# Altium footprint library TH_Connectors.PcbLib: 83 footprints (part 5 of 6)
Each footprint in its own frame and in the unit in brackets; x right, y up, seen from the top. Pads: shape width x height; smd on the part's side, far side on the other; paste and mask are expansions set on the pad; w line width, h text height; cw(c..) or ccw(c..) is an arc to the next point about the centre after c.
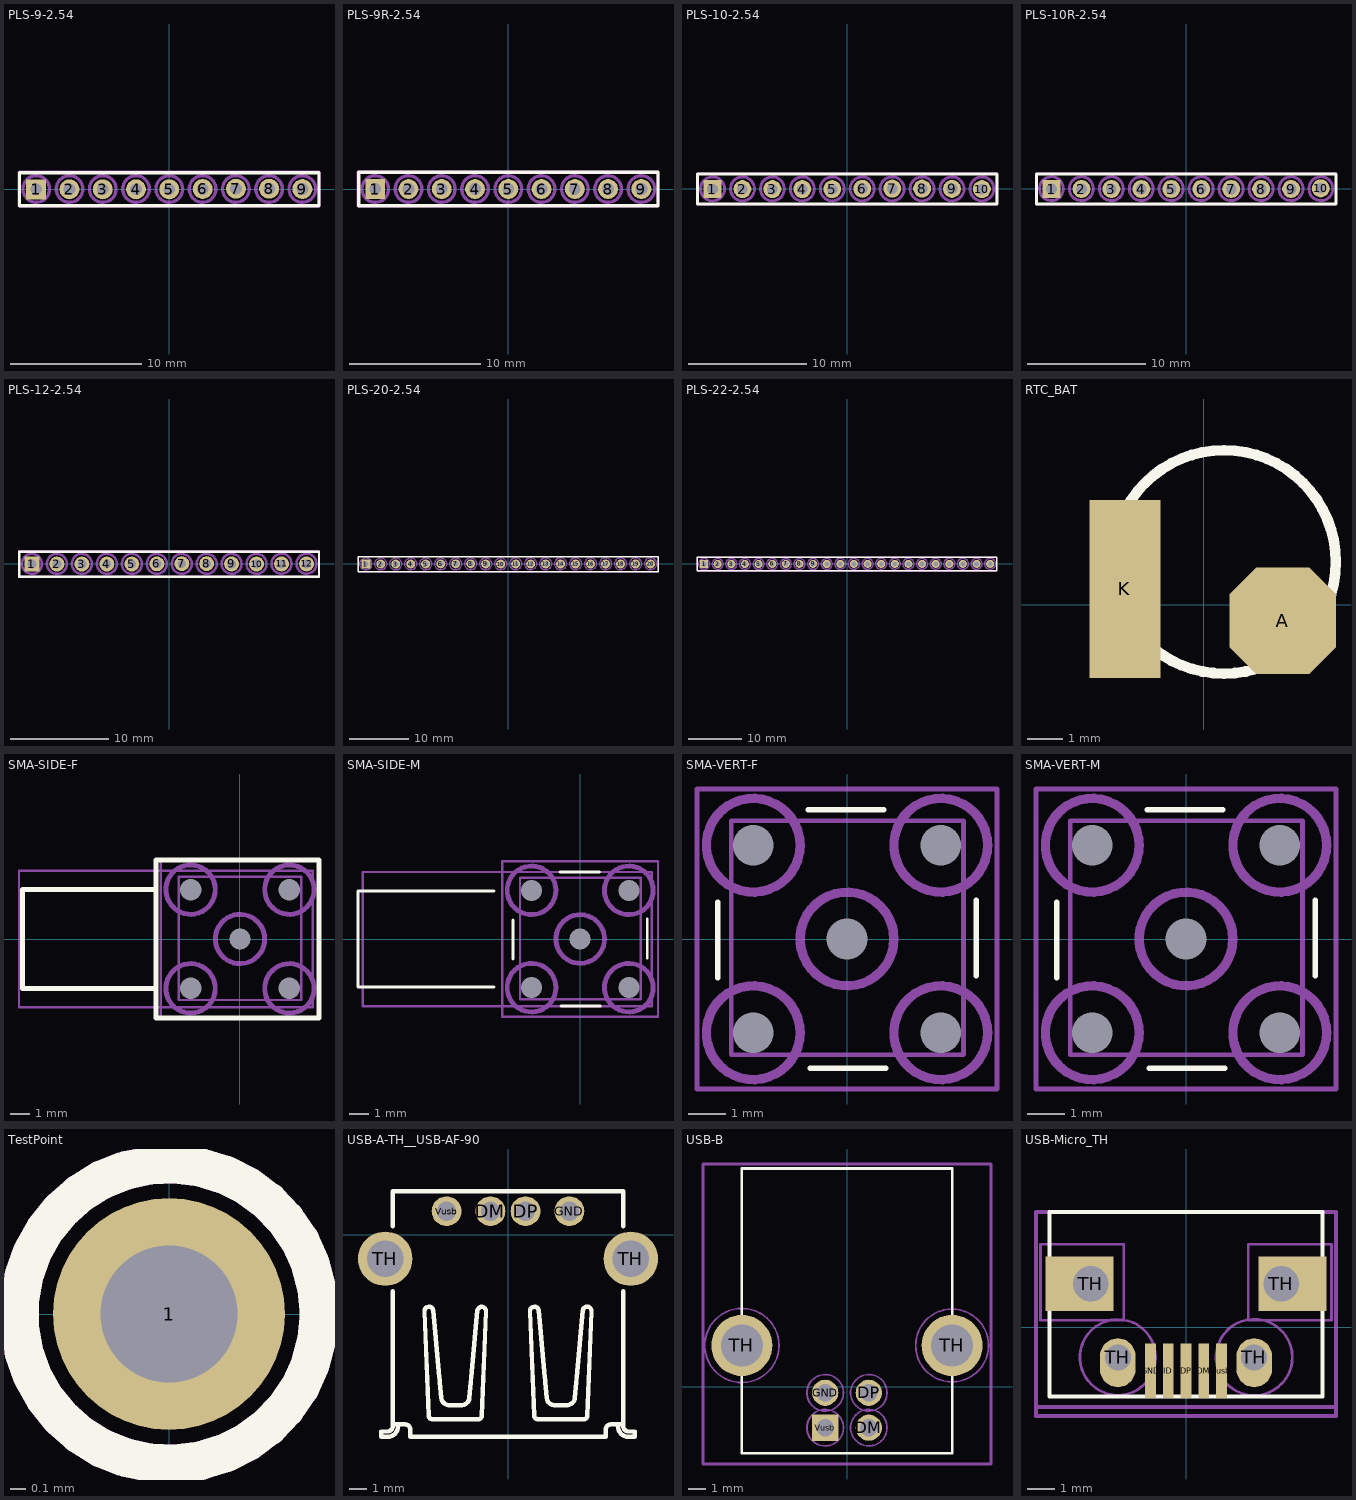
[diagram p4: the footprints below, top view; thin cyan lines are the x and y axes]

## PLS-9-2.54 [mil]
pads (9):
  rect 60x60 hole 35.43: 1(-400.06,-0.78)
  round 60 hole 35.43: 2(-300.06,-0.78) 3(-200.06,-0.78) 4(-100.06,-0.78) 5(-0.06,-0.78) 6(100.43,0.26) 7(200.43,0.78) 8(300.18,0.78) 9(400.06,0)
Top Overlay:
  lines w10: -450.06,-50.78 450.06,-50.78 450.06,49.22 -450.06,49.22 -450.06,-50.78
Top Assembly:
  lines w7.87: -451.81,-51.12 450,-51.12 450,51.25 -451.81,51.25 -451.81,-51.12
Top Courtyard:
  lines w7.87: -451.81,-51.12 450,-51.12 450,51.25 -451.81,51.25 -451.81,-51.12
Bottom Courtyard (Mech16):
  circle w10: c-400,0 r40.05
  circle w10: c-300,0 r40.05
  circle w10: c-200,0 r40.05
  circle w10: c-100,0 r40.05
  circle w10: c0,0 r40.05
  circle w10: c100,0 r40.05
  circle w10: c200,0 r40.05
  circle w10: c300,0 r40.05
  circle w10: c400,0 r40.05
3D body "PLS1.stp": height 336.22, standoff -118.11, extent 350.06,-50 450.06,50
3D body "PLS1.stp": height 336.22, standoff -118.11, extent 250.18,-49.23 350.18,50.77
3D body "PLS1.stp": height 336.22, standoff -118.11, extent 150.43,-49.23 250.43,50.77
3D body "PLS1.stp": height 336.22, standoff -118.11, extent 50.43,-49.74 150.43,50.26
3D body "PLS1.stp": height 336.22, standoff -118.11, extent -50.06,-50.77 49.94,49.23
3D body "PLS1.stp": height 336.22, standoff -118.11, extent -250.06,-50.77 -150.06,49.23
3D body "PLS1.stp": height 336.22, standoff -118.11, extent -350.06,-50.77 -250.06,49.23
3D body "PLS1.stp": height 336.22, standoff -118.11, extent -450.06,-50.77 -350.06,49.23
3D body "PLS1.stp": height 336.22, standoff -118.11, extent -150.06,-50.77 -50.06,49.23

## PLS-9R-2.54 [mil]
pads (9):
  rect 60x60 hole 35.43: 1(-400,0)
  round 60 hole 35.43: 2(-300,0) 3(-200,0) 4(-100,0) 5(0,0) 6(100,0) 7(200,0) 8(300,0) 9(400,0)
Top Overlay:
  lines w10: -250,50 150,50 -350,50 50,50 ; -450,-50 -450,50 450,50 450,-50 -450,-50
Top Assembly:
  lines w7.87: -451.81,-51.12 -451.81,51.25 450,51.25 450,-51.12 -451.81,-51.12
Top Courtyard:
  lines w7.87: -451.81,-51.12 450,-51.12 450,51.25 -451.81,51.25 -451.81,-51.12
Bottom Courtyard (Mech16):
  circle w10: c400,0 r40.05
  circle w10: c300,0 r40.05
  circle w10: c200,0 r40.05
  circle w10: c100,0 r40.05
  circle w10: c0,0 r40.05
  circle w10: c-100,0 r40.05
  circle w10: c-200,0 r40.05
  circle w10: c-300,0 r40.05
  circle w10: c-400,0 r40.05
3D body "User Library-PLS-1R.STEP": height 229.57, standoff -103.11, extent 350,-50 450,289.37
3D body "User Library-PLS-1R.STEP": height 229.57, standoff -103.11, extent 250,-50 350,289.37
3D body "User Library-PLS-1R.STEP": height 229.57, standoff -103.11, extent -350,-50 -250,289.37
3D body "User Library-PLS-1R.STEP": height 229.57, standoff -103.11, extent -450,-50 -350,289.37
3D body "User Library-PLS-1R.STEP": height 229.57, standoff -103.11, extent -150,-50 -50,289.37
3D body "User Library-PLS-1R.STEP": height 229.57, standoff -103.11, extent -250,-50 -150,289.37
3D body "User Library-PLS-1R.STEP": height 229.57, standoff -103.11, extent -50,-50 50,289.37
3D body "User Library-PLS-1R.STEP": height 229.57, standoff -103.11, extent 50,-50 150,289.37
3D body "User Library-PLS-1R.STEP": height 229.57, standoff -103.11, extent 150,-50 250,289.37

## PLS-10-2.54 [mil]
pads (10):
  rect 60x60 hole 35.43: 1(-450.03,-0.78)
  round 60 hole 35.43: 2(-350.03,-0.78) 3(-250.03,-0.78) 4(-150.03,-0.78) 5(-50.03,-0.78) 6(50.46,0.26) 7(150.46,0.78) 8(250.21,0.78) 9(350.09,0) 10(450.03,-0.78)
Top Overlay:
  lines w10: -500.03,-50.78 -500.03,49.22 500.03,49.22 500.03,-50.78 -500.03,-50.78
Top Assembly:
  lines w7.87: -501.4,-52.18 500.41,-52.18 500.41,50.2 -501.4,50.2 -501.4,-52.18
Top Courtyard:
  lines w7.87: -501.81,-51.12 500,-51.12 500,51.25 -501.81,51.25 -501.81,-51.12
Bottom Courtyard (Mech16):
  circle w10: c450,0 r40.05
  circle w10: c350,0 r40.05
  circle w10: c250,0 r40.05
  circle w10: c150,0 r40.05
  circle w10: c50,0 r40.05
  circle w10: c-50,0 r40.05
  circle w10: c-150,0 r40.05
  circle w10: c-250,0 r40.05
  circle w10: c-350,0 r40.05
  circle w10: c-450,0 r40.05
3D body "PLS1.stp": height 336.22, standoff -118.11, extent -200.03,-50.77 -100.03,49.23
3D body "PLS1.stp": height 336.22, standoff -118.11, extent -500.03,-50.77 -400.03,49.23
3D body "PLS1.stp": height 336.22, standoff -118.11, extent -400.03,-50.77 -300.03,49.23
3D body "PLS1.stp": height 336.22, standoff -118.11, extent -300.03,-50.77 -200.03,49.23
3D body "PLS1.stp": height 336.22, standoff -118.11, extent -100.03,-50.77 -0.03,49.23
3D body "PLS1.stp": height 336.22, standoff -118.11, extent 0.46,-49.74 100.46,50.26
3D body "PLS1.stp": height 336.22, standoff -118.11, extent 100.46,-49.23 200.46,50.77
3D body "PLS1.stp": height 336.22, standoff -118.11, extent 200.21,-49.23 300.21,50.77
3D body "PLS1.stp": height 336.22, standoff -118.11, extent 300.09,-50 400.09,50
3D body "PLS1.stp": height 336.22, standoff -118.11, extent 400.03,-50.77 500.03,49.23

## PLS-10R-2.54 [mil]
pads (10):
  rect 60x60 hole 35.43: 1(-449.59,-1.05)
  round 60 hole 35.43: 2(-349.59,-1.05) 3(-249.59,-1.05) 4(-149.59,-1.05) 5(-49.59,-1.05) 6(50.41,-1.05) 7(150.41,-1.05) 8(250.41,-1.05) 9(350.41,-1.05) 10(449.59,1.05)
Top Overlay:
  lines w10: -299.59,48.95 100.41,48.95 -399.59,48.95 0.41,48.95 ; -499.59,-51.05 -499.59,48.95 500.41,48.95 500.41,-51.05 -499.59,-51.05
Top Assembly:
  lines w7.87: -501.4,-52.18 -501.4,50.2 500.41,50.2 500.41,-52.18 -501.4,-52.18
Top Courtyard:
  lines w7.87: -501.4,-52.18 500.41,-52.18 500.41,50.2 -501.4,50.2 -501.4,-52.18
Bottom Courtyard (Mech16):
  circle w10: c-450,0 r40.05
  circle w10: c-350,0 r40.05
  circle w10: c-250,0 r40.05
  circle w10: c-150,0 r40.05
  circle w10: c-50,0 r40.05
  circle w10: c50,0 r40.05
  circle w10: c150,0 r40.05
  circle w10: c250,0 r40.05
  circle w10: c350,0 r40.05
  circle w10: c450,0 r40.05
3D body "User Library-PLS-1R.STEP": height 229.57, standoff -103.11, extent 300.41,-51.05 400.41,288.32
3D body "User Library-PLS-1R.STEP": height 229.57, standoff -103.11, extent 200.41,-51.05 300.41,288.32
3D body "User Library-PLS-1R.STEP": height 229.57, standoff -103.11, extent -399.59,-51.05 -299.59,288.32
3D body "User Library-PLS-1R.STEP": height 229.57, standoff -103.11, extent -499.59,-51.05 -399.59,288.32
3D body "User Library-PLS-1R.STEP": height 229.57, standoff -103.11, extent -199.59,-51.05 -99.59,288.32
3D body "User Library-PLS-1R.STEP": height 229.57, standoff -103.11, extent -299.59,-51.05 -199.59,288.32
3D body "User Library-PLS-1R.STEP": height 229.57, standoff -103.11, extent -99.59,-51.05 0.41,288.32
3D body "User Library-PLS-1R.STEP": height 229.57, standoff -103.11, extent 0.41,-51.05 100.41,288.32
3D body "User Library-PLS-1R.STEP": height 229.57, standoff -103.11, extent 100.41,-51.05 200.41,288.32
3D body "User Library-PLS-1R.STEP": height 229.57, standoff -103.11, extent 400.41,-51.05 500.41,288.32

## PLS-12-2.54 [mil]
pads (12):
  rect 60x60 hole 35.43: 1(-550.02,-0.78)
  round 60 hole 35.43: 2(-450.02,-0.78) 3(-350.02,-0.78) 4(-250.02,-0.78) 5(-150.02,-0.78) 6(-49.53,0.26) 7(50.47,0.78) 8(150.23,0.78) 9(250.11,0) 10(350.05,-0.78) 11(450.02,0) 12(550.02,0)
Top Overlay:
  lines w10: -600.02,-50.78 -600.02,49.22 600.02,49.22 600.02,-50.78 -600.02,-50.78
Top Assembly:
  lines w7.87: -601.39,-52.18 600.02,-52.18 600.02,50.2 -601.39,50.2 -601.39,-52.18
Top Courtyard:
  lines w7.87: -601.8,-51.12 600.02,-51.12 600.02,51.25 -601.8,51.25 -601.8,-51.12
Bottom Courtyard (Mech16):
  circle w10: c549.98,0.78 r40.05
  circle w10: c449.98,0.78 r40.05
  circle w10: c350.02,0 r40.05
  circle w10: c250.02,0 r40.05
  circle w10: c150.02,0 r40.05
  circle w10: c50.02,0 r40.05
  circle w10: c-49.98,0 r40.05
  circle w10: c-149.98,0 r40.05
  circle w10: c-249.98,0 r40.05
  circle w10: c-349.98,0 r40.05
  circle w10: c-449.98,0 r40.05
  circle w10: c-549.98,0 r40.05
3D body "PLS1.stp": height 336.22, standoff -118.11, extent 500.01,-50 600.01,50
3D body "PLS1.stp": height 336.22, standoff -118.11, extent 400.01,-50 500.01,50
3D body "PLS1.stp": height 336.22, standoff -118.11, extent -300.01,-50.77 -200.01,49.23
3D body "PLS1.stp": height 336.22, standoff -118.11, extent -600.01,-50.77 -500.01,49.23
3D body "PLS1.stp": height 336.22, standoff -118.11, extent -500.01,-50.77 -400.01,49.23
3D body "PLS1.stp": height 336.22, standoff -118.11, extent -400.01,-50.77 -300.01,49.23
3D body "PLS1.stp": height 336.22, standoff -118.11, extent -200.01,-50.77 -100.01,49.23
3D body "PLS1.stp": height 336.22, standoff -118.11, extent -99.53,-49.74 0.47,50.26
3D body "PLS1.stp": height 336.22, standoff -118.11, extent 0.47,-49.23 100.47,50.77
3D body "PLS1.stp": height 336.22, standoff -118.11, extent 100.23,-49.23 200.23,50.77
3D body "PLS1.stp": height 336.22, standoff -118.11, extent 200.11,-50 300.11,50
3D body "PLS1.stp": height 336.22, standoff -118.11, extent 300.04,-50.77 400.04,49.23

## PLS-20-2.54 [mil]
pads (20):
  rect 60x60 hole 35.43: 1(-950.01,-0.78)
  round 60 hole 35.43: 2(-850.01,-0.78) 3(-750.01,-0.78) 4(-650.01,-0.78) 5(-550.01,-0.78) 6(-449.52,0.26) 7(-349.52,0.78) 8(-249.76,0.78) 9(-149.89,0) 10(-49.95,-0.78) 11(50.02,0) 12(150.02,0) 13(250.01,0) 14(350.01,0) 15(450.01,0) 16(550.01,0) 17(650.01,0) 18(750.01,0) 19(850.01,0) 20(950.01,0)
Top Overlay:
  lines w10: -1000.01,-50.78 1000.01,-50.78 1000.01,49.22 -1000.01,49.22 -1000.01,-50.78
Top Assembly:
  lines w7.87: -1001.38,-52.18 -1001.38,50.2 1000.01,50.2 1000.01,-52.18 -1001.38,-52.18
Top Courtyard:
  lines w7.87: -1001.79,-51.12 -1001.79,51.25 1000.01,51.25 1000.01,-51.12 -1001.79,-51.12
Bottom Courtyard (Mech16):
  circle w10: c-949.98,0 r40.05
  circle w10: c-849.98,0 r40.05
  circle w10: c-749.98,0 r40.05
  circle w10: c-649.98,0 r40.05
  circle w10: c-549.98,0 r40.05
  circle w10: c-449.98,0 r40.05
  circle w10: c-349.98,0 r40.05
  circle w10: c-249.98,0 r40.05
  circle w10: c-149.98,0 r40.05
  circle w10: c-49.98,0 r40.05
  circle w10: c49.99,0.78 r40.05
  circle w10: c149.99,0.78 r40.05
  circle w10: c249.98,0.78 r40.05
  circle w10: c349.98,0.78 r40.05
  circle w10: c449.98,0.78 r40.05
  circle w10: c549.98,0.78 r40.05
  circle w10: c649.98,0.78 r40.05
  circle w10: c749.98,0.78 r40.05
  circle w10: c849.98,0.78 r40.05
  circle w10: c949.98,0.78 r40.05
3D body "PLS1.stp": height 336.22, standoff -118.11, extent -99.95,-50.77 0.05,49.23
3D body "PLS1.stp": height 336.22, standoff -118.11, extent -199.88,-50 -99.88,50
3D body "PLS1.stp": height 336.22, standoff -118.11, extent -299.76,-49.23 -199.76,50.77
3D body "PLS1.stp": height 336.22, standoff -118.11, extent -399.52,-49.23 -299.52,50.77
3D body "PLS1.stp": height 336.22, standoff -118.11, extent -499.52,-49.74 -399.52,50.26
3D body "PLS1.stp": height 336.22, standoff -118.11, extent -600.01,-50.77 -500.01,49.23
3D body "PLS1.stp": height 336.22, standoff -118.11, extent -800.01,-50.77 -700.01,49.23
3D body "PLS1.stp": height 336.22, standoff -118.11, extent -900.01,-50.77 -800.01,49.23
3D body "PLS1.stp": height 336.22, standoff -118.11, extent -1000.01,-50.77 -900.01,49.23
3D body "PLS1.stp": height 336.22, standoff -118.11, extent -700.01,-50.77 -600.01,49.23
3D body "PLS1.stp": height 336.22, standoff -118.11, extent 0.02,-50 100.02,50
3D body "PLS1.stp": height 336.22, standoff -118.11, extent 100.02,-50 200.02,50
3D body "PLS1.stp": height 336.22, standoff -118.11, extent 200.01,-50 300.01,50
3D body "PLS1.stp": height 336.22, standoff -118.11, extent 300.01,-50 400.01,50
3D body "PLS1.stp": height 336.22, standoff -118.11, extent 400.01,-50 500.01,50
3D body "PLS1.stp": height 336.22, standoff -118.11, extent 500.01,-50 600.01,50
3D body "PLS1.stp": height 336.22, standoff -118.11, extent 600.01,-50 700.01,50
3D body "PLS1.stp": height 336.22, standoff -118.11, extent 700.01,-50 800.01,50
3D body "PLS1.stp": height 336.22, standoff -118.11, extent 800.01,-50 900.01,50
3D body "PLS1.stp": height 336.22, standoff -118.11, extent 900.01,-50 1000.01,50

## PLS-22-2.54 [mil]
pads (22):
  rect 60x60 hole 35.43: 1(-1050,-0.78)
  round 60 hole 35.43: 2(-950,-0.78) 3(-850,-0.78) 4(-750,-0.78) 5(-650,-0.78) 6(-549.52,0.26) 7(-449.52,0.78) 8(-349.76,0.78) 9(-249.88,0) 10(-149.94,-0.78) 11(-49.97,0) 12(50.03,0) 13(150.01,0) 14(250.01,0) 15(350.01,0) 16(450.01,0) 17(550.01,0) 18(650.01,0) 19(750.01,0) 20(850.01,0) 21(950,0) 22(1050,0)
Top Overlay:
  lines w10: -1100,-50.78 -1100,49.22 1100,49.22 1100,-50.78 -1100,-50.78
Top Assembly:
  lines w7.87: -1101.38,-52.18 1100,-52.18 1100,50.2 -1101.38,50.2 -1101.38,-52.18
Top Courtyard:
  lines w7.87: -1101.78,-51.12 1100,-51.12 1100,51.25 -1101.78,51.25 -1101.78,-51.12
Bottom Courtyard (Mech16):
  circle w10: c1049.97,0.78 r40.05
  circle w10: c949.97,0.78 r40.05
  circle w10: c849.98,0.78 r40.05
  circle w10: c749.98,0.78 r40.05
  circle w10: c649.98,0.78 r40.05
  circle w10: c549.98,0.78 r40.05
  circle w10: c449.98,0.78 r40.05
  circle w10: c349.98,0.78 r40.05
  circle w10: c249.98,0.78 r40.05
  circle w10: c149.98,0.78 r40.05
  circle w10: c50,0.78 r40.05
  circle w10: c-50,0.78 r40.05
  circle w10: c-149.97,0 r40.05
  circle w10: c-249.97,0 r40.05
  circle w10: c-349.97,0 r40.05
  circle w10: c-449.97,0 r40.05
  circle w10: c-549.97,0 r40.05
  circle w10: c-649.97,0 r40.05
  circle w10: c-749.97,0 r40.05
  circle w10: c-849.97,0 r40.05
  circle w10: c-949.97,0 r40.05
  circle w10: c-1049.97,0 r40.05
3D body "PLS1.stp": height 336.22, standoff -118.11, extent 1000,-50 1100,50
3D body "PLS1.stp": height 336.22, standoff -118.11, extent 900,-50 1000,50
3D body "PLS1.stp": height 336.22, standoff -118.11, extent 800.01,-50 900.01,50
3D body "PLS1.stp": height 336.22, standoff -118.11, extent 700.01,-50 800.01,50
3D body "PLS1.stp": height 336.22, standoff -118.11, extent 600.01,-50 700.01,50
3D body "PLS1.stp": height 336.22, standoff -118.11, extent 500.01,-50 600.01,50
3D body "PLS1.stp": height 336.22, standoff -118.11, extent 400.01,-50 500.01,50
3D body "PLS1.stp": height 336.22, standoff -118.11, extent 300.01,-50 400.01,50
3D body "PLS1.stp": height 336.22, standoff -118.11, extent 200.01,-50 300.01,50
3D body "PLS1.stp": height 336.22, standoff -118.11, extent 100.01,-50 200.01,50
3D body "PLS1.stp": height 336.22, standoff -118.11, extent 0.03,-50 100.03,50
3D body "PLS1.stp": height 336.22, standoff -118.11, extent -99.97,-50 0.03,50
3D body "PLS1.stp": height 336.22, standoff -118.11, extent -800,-50.77 -700,49.23
3D body "PLS1.stp": height 336.22, standoff -118.11, extent -1100,-50.77 -1000,49.23
3D body "PLS1.stp": height 336.22, standoff -118.11, extent -1000,-50.77 -900,49.23
3D body "PLS1.stp": height 336.22, standoff -118.11, extent -900,-50.77 -800,49.23
3D body "PLS1.stp": height 336.22, standoff -118.11, extent -700,-50.77 -600,49.23
3D body "PLS1.stp": height 336.22, standoff -118.11, extent -599.52,-49.74 -499.52,50.26
3D body "PLS1.stp": height 336.22, standoff -118.11, extent -499.52,-49.23 -399.52,50.77
3D body "PLS1.stp": height 336.22, standoff -118.11, extent -399.76,-49.23 -299.76,50.77
3D body "PLS1.stp": height 336.22, standoff -118.11, extent -299.88,-50 -199.88,50
3D body "PLS1.stp": height 336.22, standoff -118.11, extent -199.94,-50.77 -99.94,49.23

## RTC_BAT [mil]
pads (2):
  oct 118.11x118.11 smd: A(87.5,-17.5)
  rect 78.74x196.85 smd: K(-87.5,17.5)
Top Overlay:
  circle w11.81: c22.5,47.5 r123.79

## SMA-SIDE-F [mm]
pads (5):
  round 0 / inner round 2 / far side round 2 hole 1.1: 0(-2.54,-2.54) 0(-2.54,2.54) 0(2.54,-2.54) 0(2.54,2.54) 1(0,0)
Top Overlay:
  lines w0.254: -4.318,-2.54 -11.176,-2.54 -11.176,2.54 -4.318,2.54 ; -4.318,-4.064 -3.81,-4.064 4.064,-4.064 4.064,4.064 -4.318,4.064 -4.318,-4.064
Top Assembly:
  lines w0.127: -11.361,-3.506 -11.361,3.497 3.742,3.497 3.742,-3.506 -11.361,-3.506 ; -3.14,-3.137 -3.14,3.205 3.155,3.205 3.155,-3.137 -3.14,-3.137
Top Courtyard:
  lines w0.127: -4.064,-4.064 -4.064,4.064 4.064,4.064 4.064,-4.064 -4.064,-4.064
Bottom Courtyard (Mech16):
  circle w0.254: c-2.54,2.54 r1.27
  circle w0.254: c0,0 r1.27
  circle w0.254: c2.54,2.54 r1.27
  circle w0.254: c2.54,-2.54 r1.27
  circle w0.254: c-2.54,-2.54 r1.27
3D body "SMA-F (R).step": height 10.86, standoff -3.24, extent -11.36,-3.556 3.74,3.444

## SMA-SIDE-M [mm]
pads (5):
  round 0 / inner round 2 / far side round 2 hole 1.1: 0(-2.54,-2.54) 0(-2.54,2.54) 0(2.54,-2.54) 0(2.54,2.54) 1(0,0)
Top Overlay:
  lines w0.15: -4.5,-2.5 -11.6,-2.5 -11.6,2.5 -4.5,2.5 ; -3.5,-1.05 -3.5,0 -3.5,1 ; -1.05,3.5 0,3.5 1,3.5 ; -1,-3.5 0,-3.5 1.05,-3.5 ; 3.5,-1 3.5,0 3.5,1.05
Top Assembly:
  lines w0.127: -11.361,-3.506 3.742,-3.506 3.742,3.497 -11.361,3.497 -11.361,-3.506 ; -3.14,-3.137 3.155,-3.137 3.155,3.205 -3.14,3.205 -3.14,-3.137
Top Courtyard:
  lines w0.127: -4.064,-4.064 4.064,-4.064 4.064,4.064 -4.064,4.064 -4.064,-4.064
Bottom Courtyard (Mech16):
  circle w0.254: c-2.54,-2.54 r1.27
  circle w0.254: c2.54,-2.54 r1.27
  circle w0.254: c2.54,2.54 r1.27
  circle w0.254: c0,0 r1.27
  circle w0.254: c-2.54,2.54 r1.27
3D body "SMA-F (R).step": height 11.86, standoff -2.24, extent -11.36,-3.556 3.74,3.444
3D body: height 9, standoff 7.8, extent -11.35,-0.599 -1.35,0.599

## SMA-VERT-F [mm]
pads (5):
  round 0 / inner round 2 / far side round 2 hole 1.1: 0(-2.54,-2.54) 0(-2.54,2.54) 0(2.54,-2.54) 0(2.54,2.54) 1(0,0)
Top Overlay:
  lines w0.15: -3.5,-1.05 -3.5,0 -3.5,1 ; -1.05,3.5 0,3.5 1,3.5 ; -1,-3.5 0,-3.5 1.05,-3.5 ; 3.5,-1 3.5,0 3.5,1.05
Top Assembly:
  lines w0.127: -3.14,-3.137 3.155,-3.137 3.155,3.205 -3.14,3.205 -3.14,-3.137
Top Courtyard:
  lines w0.127: -4.064,-4.064 4.064,-4.064 4.064,4.064 -4.064,4.064 -4.064,-4.064
Bottom Courtyard (Mech16):
  circle w0.254: c-2.54,2.54 r1.27
  circle w0.254: c0,0 r1.27
  circle w0.254: c2.54,2.54 r1.27
  circle w0.254: c2.54,-2.54 r1.27
  circle w0.254: c-2.54,-2.54 r1.27
3D body "User Library-sma.STEP": height 10.39, standoff -3.06, extent -3.155,-3.155 3.155,3.155

## SMA-VERT-M [mm]
pads (5):
  round 0 / inner round 2 / far side round 2 hole 1.1: 0(-2.54,-2.54) 0(-2.54,2.54) 0(2.54,-2.54) 0(2.54,2.54) 1(0,0)
Top Overlay:
  lines w0.15: -3.5,-1.05 -3.5,0 -3.5,1 ; -1.05,3.5 0,3.5 1,3.5 ; -1,-3.5 0,-3.5 1.05,-3.5 ; 3.5,-1 3.5,0 3.5,1.05
Top Assembly:
  lines w0.127: -3.14,-3.137 -3.14,3.205 3.155,3.205 3.155,-3.137 -3.14,-3.137
Top Courtyard:
  lines w0.127: -4.064,-4.064 -4.064,4.064 4.064,4.064 4.064,-4.064 -4.064,-4.064
Bottom Courtyard (Mech16):
  circle w0.254: c-2.54,-2.54 r1.27
  circle w0.254: c2.54,-2.54 r1.27
  circle w0.254: c2.54,2.54 r1.27
  circle w0.254: c0,0 r1.27
  circle w0.254: c-2.54,2.54 r1.27
3D body: height 10, standoff 0, extent -0.595,-0.599 0.6,0.599
3D body "User Library-sma.STEP": height 9.45, standoff -4, extent -3.155,-3.155 3.155,3.155

## TestPoint [mil]
pads (1):
  round 60 hole 35.43: 1(0,0)
Top Overlay:
  circle w10: c0,0 r38.84
Bottom Overlay:
  circle w10: c0,0 r38.84
Top Courtyard:
  circle w10: c0,0 r38.84
Bottom Courtyard (Mech16):
  circle w10: c0,0 r38.84

## USB-A-TH__USB-AF-90 [mm]
pads (6):
  round 1.7 hole 1.1: DM(-1,1.355) DP(1,1.355) GND(3.5,1.355) Vusb(-3.5,1.355)
  round 3.1 hole 2.1: TH(-7,-1.355) TH(7,-1.355)
Top Overlay:
  drawing of 192 lines, arcs and shapes, not listed
3D body "875200012blf.stp": height 9.14, standoff -1.34, extent -7.25,-11.75 7.25,2.25

## USB-B [mm]
pads (6):
  round 1.5 hole 1 mask+0.05: DM(1.25,-2.355) DP(1.25,-0.355) GND(-1.25,-0.355)
  round 3.5 hole 2.4 mask+0.05: TH(-6.02,2.355) TH(6.02,2.355)
  rect 1.5x1.5 hole 1 mask+0.05: Vusb(-1.25,-2.355)
Top Overlay:
  lines w0.15: -6.02,-3.83 6.02,-3.83 6.02,12.495 -6.02,12.495 -6.02,-3.83
Top Assembly:
  lines w0.15: -8.25,-4.435 8.25,-4.435 8.25,12.75 -8.25,12.75 -8.25,-4.435
Top Courtyard:
  lines w0.15: -8.25,-4.435 8.25,-4.435 8.25,12.75 -8.25,12.75 -8.25,-4.435
Bottom Courtyard (Mech16):
  circle w0.1: c-1.25,-0.355 r1.047
  circle w0.1: c-1.25,-2.355 r1.047
  circle w0.1: c1.25,-2.355 r1.047
  circle w0.1: c1.25,-0.355 r1.047
  circle w0.1: c6.02,2.355 r2.086
  circle w0.1: c-6.02,2.355 r2.125
3D body "USB B.STEP": height 12, standoff -2.64, extent -7.373,-3.855 7.425,12.645

## USB-Micro_TH [mm]
pads (9):
  rect 0.4x2 smd: DM(0.65,-1.6) DP(0,-1.6) GND(-1.3,-1.6) ID(-0.65,-1.6) Vusb(1.3,-1.6)
  rect 2.5x2 / inner rect 2.5x2 / far side rect 2x2 hole 1.3 copper offset -0.4,0: TH(-3.5,1.6)
  oval 1.3x1.8 hole 0.95 copper offset 0,-0.2: TH(-2.5,-1.1) TH(2.5,-1.1)
  rect 2.5x2 / inner rect 2.5x2 / far side rect 2x2 hole 1.3 copper offset 0.4,0: TH(3.5,1.6)
Top Overlay:
  lines w0.15: -5,-2.54 -5,4.225 5,4.225 5,-2.54 -5,-2.54
Top Assembly:
  lines w0.15: -5.5,-3.25 5.5,-3.25 5.5,4.225 -5.5,4.225 -5.5,-3.25
Top Courtyard:
  lines w0.15: -5.5,-2.922 -5.5,4.225 5.5,4.225 5.5,-2.922 -5.5,-2.922
Bottom Courtyard (Mech16):
  circle w0.1: c2.5,-1.1 r1.4
  circle w0.1: c-2.5,-1.1 r1.388
  lines w0.1: -5.334,0.254 -5.334,3.048 -2.286,3.048 -2.286,0.254 -5.334,0.254 ; 2.286,0.254 2.286,3.048 5.334,3.048 5.334,0.254 2.286,0.254
3D body "Micro USB-B Female 5Pin SMD.STEP": height 2.7, standoff -1.02, extent -4.05,-1.575 4,4.225